# Altium footprint library PcbLib_ICs.PcbLib: 317 footprints (part 15 of 24)
Each footprint in its own frame and in the unit in brackets; x right, y up, seen from the top. Pads: shape width x height; smd on the part's side, far side on the other; paste and mask are expansions set on the pad; w line width, h text height; cw(c..) or ccw(c..) is an arc to the next point about the centre after c.
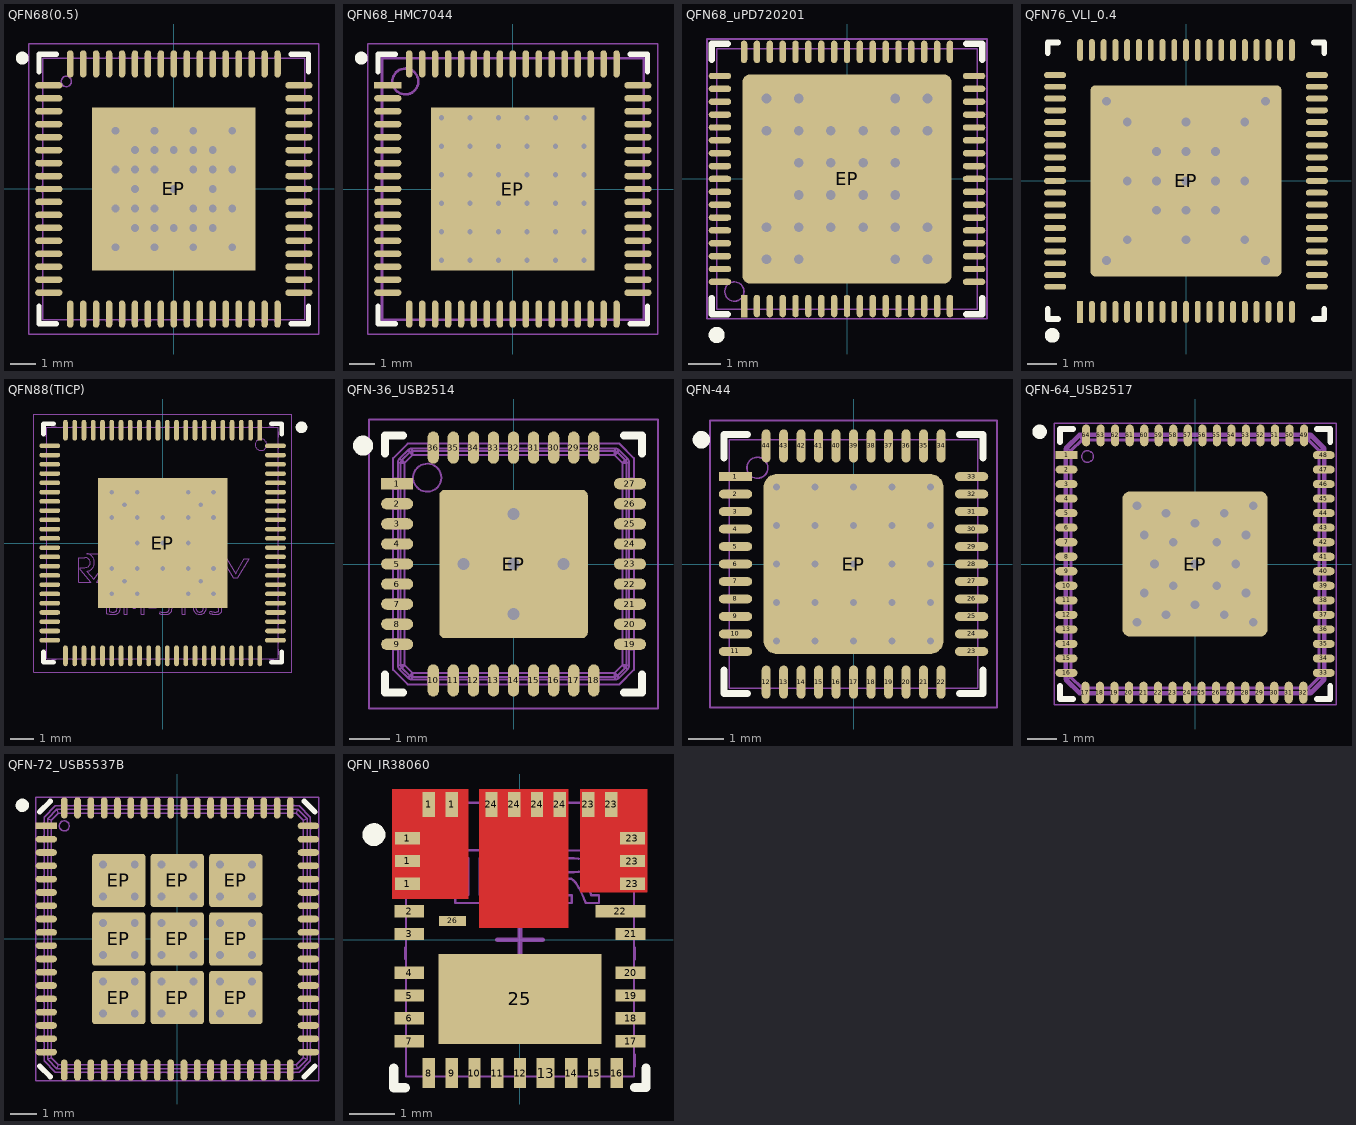
[diagram p14: the footprints below, top view; thin cyan lines are the x and y axes]

## QFN68(0.5) [mm] "QFN, 68-Leads, Body 10.00x10.00mm, Pitch 0.50mm, Thermal Pad 6.30x6.30mm, IPC Medium Density"
height 0.9
pads (69):
  oval 1.05x0.25 smd paste+0 mask+0.075: 1(-4.825,4) 2(-4.825,3.5) 3(-4.825,3) 4(-4.825,2.5) 5(-4.825,2) 6(-4.825,1.5) 7(-4.825,1) 8(-4.825,0.5) 9(-4.825,0) 10(-4.825,-0.5) 11(-4.825,-1) 12(-4.825,-1.5) 13(-4.825,-2) 14(-4.825,-2.5) 15(-4.825,-3) 16(-4.825,-3.5) 17(-4.825,-4) 35(4.825,-4) 36(4.825,-3.5) 37(4.825,-3) 38(4.825,-2.5) 39(4.825,-2) 40(4.825,-1.5) 41(4.825,-1) 42(4.825,-0.5) 43(4.825,0) 44(4.825,0.5) 45(4.825,1) 46(4.825,1.5) 47(4.825,2) 48(4.825,2.5) 49(4.825,3) 50(4.825,3.5) 51(4.825,4)
  oval 0.25x1.05 smd paste+0 mask+0.075: 18(-4,-4.825) 19(-3.5,-4.825) 20(-3,-4.825) 21(-2.5,-4.825) 22(-2,-4.825) 23(-1.5,-4.825) 24(-1,-4.825) 25(-0.5,-4.825) 26(0,-4.825) 27(0.5,-4.825) 28(1,-4.825) 29(1.5,-4.825) 30(2,-4.825) 31(2.5,-4.825) 32(3,-4.825) 33(3.5,-4.825) 34(4,-4.825) 52(4,4.825) 53(3.5,4.825) 54(3,4.825) 55(2.5,4.825) 56(2,4.825) 57(1.5,4.825) 58(1,4.825) 59(0.5,4.825) 60(0,4.825) 61(-0.5,4.825) 62(-1,4.825) 63(-1.5,4.825) 64(-2,4.825) 65(-2.5,4.825) 66(-3,4.825) 67(-3.5,4.825) 68(-4,4.825)
  rect 6.3x6.3 smd paste-50 mask+0.075: EP(0,0)
via -1.5,0.75 diameter 0.7 hole 0.3
via -1.5,-0.75 diameter 0.7 hole 0.3
via -2.25,0.75 diameter 0.7 hole 0.3
via -0.75,2.25 diameter 0.7 hole 0.3
via -2.25,2.25 diameter 0.7 hole 0.3
via -2.25,-0.75 diameter 0.7 hole 0.3
via -0.75,-2.25 diameter 0.7 hole 0.3
via -2.25,-2.25 diameter 0.7 hole 0.3
via -1.5,-1.5 diameter 0.7 hole 0.3
via -0.75,-0.75 diameter 0.7 hole 0.3
via 0.75,-2.25 diameter 0.7 hole 0.3
via 2.25,-0.75 diameter 0.7 hole 0.3
via 2.25,-2.25 diameter 0.7 hole 0.3
via 1.5,-1.5 diameter 0.7 hole 0.3
via 0.75,-0.75 diameter 0.7 hole 0.3
via 2.25,0.75 diameter 0.7 hole 0.3
via 0.75,2.25 diameter 0.7 hole 0.3
via 2.25,2.25 diameter 0.7 hole 0.3
via 1.5,1.5 diameter 0.7 hole 0.3
via 0.75,0.75 diameter 0.7 hole 0.3
via 0,0 diameter 0.7 hole 0.3
via -0.75,-1.5 diameter 0.7 hole 0.3
via 0.75,-1.5 diameter 0.7 hole 0.3
via 1.5,-0.75 diameter 0.7 hole 0.3
via 1.5,0.75 diameter 0.7 hole 0.3
via 0.75,1.5 diameter 0.7 hole 0.3
via -0.75,1.5 diameter 0.7 hole 0.3
via 0,1.5 diameter 0.7 hole 0.3
via -1.5,0 diameter 0.7 hole 0.3
via 0,-1.5 diameter 0.7 hole 0.3
via 1.5,0 diameter 0.7 hole 0.3
via -0.75,0.75 diameter 0.7 hole 0.3
via -1.5,1.5 diameter 0.7 hole 0.3
Top Overlay:
  circle w0.25: c-5.85,5.05 r0.125
  lines w0.2: -5.2,-4.525 -5.2,-5.2 -4.525,-5.2 ; -5.2,4.525 -5.2,5.2 -4.525,5.2 ; 4.525,-5.2 5.2,-5.2 5.2,-4.525 ; 4.525,5.2 5.2,5.2 5.2,4.525
Top Paste:
  region: 2.7,-2.7 2.7,-2.2 2.2,-2.2 2.2,-2.7
  region: -2.2,-2.7 -2.2,-2.2 -2.7,-2.2 -2.7,-2.7
  region: -1.5,-2.7 -1.5,-2.2 -2,-2.2 -2,-2.7
  region: -0.8,-2.7 -0.8,-2.2 -1.3,-2.2 -1.3,-2.7
  region: 1.3,-2.7 1.3,-2.2 0.8,-2.2 0.8,-2.7
  region: 2,-2.7 2,-2.2 1.5,-2.2 1.5,-2.7
  region: -0.1,-2.7 -0.1,-2.2 -0.6,-2.2 -0.6,-2.7
  region: 0.6,-2.7 0.6,-2.2 0.1,-2.2 0.1,-2.7
  region: -2.7,2.7 -2.7,2.2 -2.2,2.2 -2.2,2.7
  region: 2.2,2.7 2.2,2.2 2.7,2.2 2.7,2.7
  region: 1.5,2.7 1.5,2.2 2,2.2 2,2.7
  region: 0.8,2.7 0.8,2.2 1.3,2.2 1.3,2.7
  region: -1.3,2.7 -1.3,2.2 -0.8,2.2 -0.8,2.7
  region: -2,2.7 -2,2.2 -1.5,2.2 -1.5,2.7
  region: 0.1,2.7 0.1,2.2 0.6,2.2 0.6,2.7
  region: -0.6,2.7 -0.6,2.2 -0.1,2.2 -0.1,2.7
  region: -2.2,0.8 -2.2,1.3 -2.7,1.3 -2.7,0.8
  region: -2.7,2 -2.7,1.5 -2.2,1.5 -2.2,2
  region: -2.2,-2 -2.2,-1.5 -2.7,-1.5 -2.7,-2
  region: -2.7,-0.8 -2.7,-1.3 -2.2,-1.3 -2.2,-0.8
  region: -2.2,-0.6 -2.2,-0.1 -2.7,-0.1 -2.7,-0.6
  region: -2.7,0.6 -2.7,0.1 -2.2,0.1 -2.2,0.6
  region: 2.2,-0.8 2.2,-1.3 2.7,-1.3 2.7,-0.8
  region: 2.7,-2 2.7,-1.5 2.2,-1.5 2.2,-2
  region: 2.2,2 2.2,1.5 2.7,1.5 2.7,2
  region: 2.7,0.8 2.7,1.3 2.2,1.3 2.2,0.8
  region: 2.2,0.6 2.2,0.1 2.7,0.1 2.7,0.6
  region: 2.7,-0.6 2.7,-0.1 2.2,-0.1 2.2,-0.6
  region: 1.5,-0.8 1.5,-1.3 2,-1.3 2,-0.8
  region: 0.8,-0.8 0.8,-1.3 1.3,-1.3 1.3,-0.8
  region: 1.3,-2 1.3,-1.5 0.8,-1.5 0.8,-2
  region: 2,-2 2,-1.5 1.5,-1.5 1.5,-2
  region: -1.3,-0.8 -1.3,-1.3 -0.8,-1.3 -0.8,-0.8
  region: -2,-0.8 -2,-1.3 -1.5,-1.3 -1.5,-0.8
  region: -1.5,-2 -1.5,-1.5 -2,-1.5 -2,-2
  region: -0.8,-2 -0.8,-1.5 -1.3,-1.5 -1.3,-2
  region: 0.1,-0.8 0.1,-1.3 0.6,-1.3 0.6,-0.8
  region: -0.6,-0.8 -0.6,-1.3 -0.1,-1.3 -0.1,-0.8
  region: -0.1,-2 -0.1,-1.5 -0.6,-1.5 -0.6,-2
  region: 0.6,-2 0.6,-1.5 0.1,-1.5 0.1,-2
  region: 1.5,2 1.5,1.5 2,1.5 2,2
  region: 0.8,2 0.8,1.5 1.3,1.5 1.3,2
  region: 1.3,0.8 1.3,1.3 0.8,1.3 0.8,0.8
  region: 2,0.8 2,1.3 1.5,1.3 1.5,0.8
  region: -1.3,2 -1.3,1.5 -0.8,1.5 -0.8,2
  region: -2,2 -2,1.5 -1.5,1.5 -1.5,2
  region: -1.5,0.8 -1.5,1.3 -2,1.3 -2,0.8
  region: -0.8,0.8 -0.8,1.3 -1.3,1.3 -1.3,0.8
  region: 0.1,2 0.1,1.5 0.6,1.5 0.6,2
  region: -0.6,2 -0.6,1.5 -0.1,1.5 -0.1,2
  region: -0.1,0.8 -0.1,1.3 -0.6,1.3 -0.6,0.8
  region: 0.6,0.8 0.6,1.3 0.1,1.3 0.1,0.8
  region: 1.5,0.6 1.5,0.1 2,0.1 2,0.6
  region: 0.8,0.6 0.8,0.1 1.3,0.1 1.3,0.6
  region: 1.3,-0.6 1.3,-0.1 0.8,-0.1 0.8,-0.6
  region: 2,-0.6 2,-0.1 1.5,-0.1 1.5,-0.6
  region: -1.3,0.6 -1.3,0.1 -0.8,0.1 -0.8,0.6
  region: -2,0.6 -2,0.1 -1.5,0.1 -1.5,0.6
  region: -1.5,-0.6 -1.5,-0.1 -2,-0.1 -2,-0.6
  region: -0.8,-0.6 -0.8,-0.1 -1.3,-0.1 -1.3,-0.6
  region: 0.1,0.6 0.1,0.1 0.6,0.1 0.6,0.6
  region: -0.6,0.6 -0.6,0.1 -0.1,0.1 -0.1,0.6
  region: -0.1,-0.6 -0.1,-0.1 -0.6,-0.1 -0.6,-0.6
  region: 0.6,-0.6 0.6,-0.1 0.1,-0.1 0.1,-0.6
Bottom Solder:
  region: -3.25,3.25 -0.5,3.25 0,2.75 0.5,3.25 3.25,3.25 3.25,0.5 2.75,0 3.25,-0.5 3.25,-3.25 0.5,-3.25 0,-2.75 -0.5,-3.25 -3.25,-3.25 -3.25,-0.5 -2.75,0 -3.25,0.5
Top Assy:
  drawing of 209 lines, arcs and shapes, not listed
  text ".Designator" at -3.443,-0.467 h2
Top Text:
  lines w0.05: -5.6,-5.6 5.6,-5.6 5.6,5.6 -5.6,5.6 -5.6,-5.6
  lines w0.1: -0.5,0 0.5,0 ; 0,-0.5 0,0.5
3D body "QFN50P1000X1000X90_HS-69N.step": height 0.9, standoff 0, extent -5.07,-5.07 5.07,5.07

## QFN68_HMC7044 [mm] "HCP-68-1 case style"
height 0.9
pads (69):
  rect 1.05x0.25 smd mask+0.05: 1(-4.825,4)
  oval 1.05x0.25 smd mask+0.05: 2(-4.825,3.5) 3(-4.825,3) 4(-4.825,2.5) 5(-4.825,2) 6(-4.825,1.5) 7(-4.825,1) 8(-4.825,0.5) 9(-4.825,0) 10(-4.825,-0.5) 11(-4.825,-1) 12(-4.825,-1.5) 13(-4.825,-2) 14(-4.825,-2.5) 15(-4.825,-3) 16(-4.825,-3.5) 17(-4.825,-4) 35(4.825,-4) 36(4.825,-3.5) 37(4.825,-3) 38(4.825,-2.5) 39(4.825,-2) 40(4.825,-1.5) 41(4.825,-1) 42(4.825,-0.5) 43(4.825,0) 44(4.825,0.5) 45(4.825,1) 46(4.825,1.5) 47(4.825,2) 48(4.825,2.5) 49(4.825,3) 50(4.825,3.5) 51(4.825,4)
  oval 0.25x1.05 smd mask+0.05: 18(-4,-4.825) 19(-3.5,-4.825) 20(-3,-4.825) 21(-2.5,-4.825) 22(-2,-4.825) 23(-1.5,-4.825) 24(-1,-4.825) 25(-0.5,-4.825) 26(0,-4.825) 27(0.5,-4.825) 28(1,-4.825) 29(1.5,-4.825) 30(2,-4.825) 31(2.5,-4.825) 32(3,-4.825) 33(3.5,-4.825) 34(4,-4.825) 52(4,4.825) 53(3.5,4.825) 54(3,4.825) 55(2.5,4.825) 56(2,4.825) 57(1.5,4.825) 58(1,4.825) 59(0.5,4.825) 60(0,4.825) 61(-0.5,4.825) 62(-1,4.825) 63(-1.5,4.825) 64(-2,4.825) 65(-2.5,4.825) 66(-3,4.825) 67(-3.5,4.825) 68(-4,4.825)
  rect 6.3x6.3 smd mask+0.05: EP(0,0)
via 2.75,-2.75 diameter 0.4 hole 0.2
via 1.65,-2.75 diameter 0.4 hole 0.2
via 0.55,-2.75 diameter 0.4 hole 0.2
via -0.55,-2.75 diameter 0.4 hole 0.2
via -1.65,-2.75 diameter 0.4 hole 0.2
via -2.75,-2.75 diameter 0.4 hole 0.2
via 2.75,-1.65 diameter 0.4 hole 0.2
via 1.65,-1.65 diameter 0.4 hole 0.2
via 0.55,-1.65 diameter 0.4 hole 0.2
via -0.55,-1.65 diameter 0.4 hole 0.2
via -1.65,-1.65 diameter 0.4 hole 0.2
via -2.75,-1.65 diameter 0.4 hole 0.2
via 2.75,-0.55 diameter 0.4 hole 0.2
via 1.65,-0.55 diameter 0.4 hole 0.2
via 0.55,-0.55 diameter 0.4 hole 0.2
via -0.55,-0.55 diameter 0.4 hole 0.2
via -1.65,-0.55 diameter 0.4 hole 0.2
via -2.75,-0.55 diameter 0.4 hole 0.2
via 2.75,0.55 diameter 0.4 hole 0.2
via 1.65,0.55 diameter 0.4 hole 0.2
via 0.55,0.55 diameter 0.4 hole 0.2
via -0.55,0.55 diameter 0.4 hole 0.2
via -1.65,0.55 diameter 0.4 hole 0.2
via -2.75,0.55 diameter 0.4 hole 0.2
via 2.75,1.65 diameter 0.4 hole 0.2
via 1.65,1.65 diameter 0.4 hole 0.2
via 0.55,1.65 diameter 0.4 hole 0.2
via -0.55,1.65 diameter 0.4 hole 0.2
via -1.65,1.65 diameter 0.4 hole 0.2
via -2.75,1.65 diameter 0.4 hole 0.2
via 2.75,2.75 diameter 0.4 hole 0.2
via 1.65,2.75 diameter 0.4 hole 0.2
via 0.55,2.75 diameter 0.4 hole 0.2
via -0.55,2.75 diameter 0.4 hole 0.2
via -1.65,2.75 diameter 0.4 hole 0.2
via -2.75,2.75 diameter 0.4 hole 0.2
Top Overlay:
  circle w0.25: c-5.85,5.05 r0.125
  lines w0.2: -5.2,-4.525 -5.2,-5.2 -4.525,-5.2 ; -5.2,4.525 -5.2,5.2 -4.525,5.2 ; 4.525,-5.2 5.2,-5.2 5.2,-4.525 ; 4.525,5.2 5.2,5.2 5.2,4.525
Top Assy:
  circle w0.1: c-4.15,4.15 r0.5
  lines w0.1: -5.05,-5.05 5.05,-5.05 5.05,5.05 -5.05,5.05 -5.05,-5.05
Top Text:
  lines w0.05: -5.6,-5.6 5.6,-5.6 5.6,5.6 -5.6,5.6 -5.6,-5.6
  lines w0.1: -0.5,0 0.5,0 ; 0,-0.5 0,0.5
3D body "HCP-68-1.STEP": height 0.9, standoff -0.02, extent -5.02,-5.02 5.02,5.02

## QFN68_uPD720201 [mm] "QFN68, 8x8mm with 0.4mm pitch"
height 1
pads (69):
  rect 0.2x0.7 smd paste+0 mask+0.05: 1(-3.2,-3.95)
  oval 0.2x0.7 smd paste+0 mask+0.05: 2(-2.8,-3.95) 3(-2.4,-3.95) 4(-2,-3.95) 5(-1.6,-3.95) 6(-1.2,-3.95) 7(-0.8,-3.95) 8(-0.4,-3.95) 9(0,-3.95) 10(0.4,-3.95) 11(0.8,-3.95) 12(1.2,-3.95) 13(1.6,-3.95) 14(2,-3.95) 15(2.4,-3.95) 16(2.8,-3.95) 17(3.2,-3.95) 35(3.2,3.95) 36(2.8,3.95) 37(2.4,3.95) 38(2,3.95) 39(1.6,3.95) 40(1.2,3.95) 41(0.8,3.95) 42(0.4,3.95) 43(0,3.95) 44(-0.4,3.95) 45(-0.8,3.95) 46(-1.2,3.95) 47(-1.6,3.95) 48(-2,3.95) 49(-2.4,3.95) 50(-2.8,3.95) 51(-3.2,3.95)
  oval 0.7x0.2 smd paste+0 mask+0.05: 18(3.95,-3.2) 19(3.95,-2.8) 20(3.95,-2.4) 21(3.95,-2) 22(3.95,-1.6) 23(3.95,-1.2) 24(3.95,-0.8) 25(3.95,-0.4) 26(3.95,0) 27(3.95,0.4) 28(3.95,0.8) 29(3.95,1.2) 30(3.95,1.6) 31(3.95,2) 32(3.95,2.4) 33(3.95,2.8) 34(3.95,3.2) 52(-3.95,3.2) 53(-3.95,2.8) 54(-3.95,2.4) 55(-3.95,2) 56(-3.95,1.6) 57(-3.95,1.2) 58(-3.95,0.8) 59(-3.95,0.4) 60(-3.95,0) 61(-3.95,-0.4) 62(-3.95,-0.8) 63(-3.95,-1.2) 64(-3.95,-1.6) 65(-3.95,-2) 66(-3.95,-2.4) 67(-3.95,-2.8) 68(-3.95,-3.2)
  rrect7% 6.5x6.5 smd paste-50 mask+0.102: EP(0,0)
via 0.5,1.5 diameter 0.7 hole 0.3
via -0.5,1.5 diameter 0.7 hole 0.3
via -1.5,0.5 diameter 0.7 hole 0.3
via -1.5,-0.5 diameter 0.7 hole 0.3
via -0.5,-1.5 diameter 0.7 hole 0.3
via 0.5,-1.5 diameter 0.7 hole 0.3
via 1.5,0.5 diameter 0.7 hole 0.3
via 1.5,-0.5 diameter 0.7 hole 0.3
via 0.5,-0.5 diameter 0.7 hole 0.3
via 0.5,0.5 diameter 0.7 hole 0.3
via -0.5,0.5 diameter 0.7 hole 0.3
via -0.5,-0.5 diameter 0.7 hole 0.3
via 1.5,-1.5 diameter 0.7 hole 0.3
via 1.5,-2.5 diameter 0.7 hole 0.3
via 2.5,-1.5 diameter 0.7 hole 0.3
via 2.5,-2.5 diameter 0.7 hole 0.3
via 1.5,1.5 diameter 0.7 hole 0.3
via 1.5,2.5 diameter 0.7 hole 0.3
via 2.5,1.5 diameter 0.7 hole 0.3
via 2.5,2.5 diameter 0.7 hole 0.3
via -1.5,1.5 diameter 0.7 hole 0.3
via -1.5,2.5 diameter 0.7 hole 0.3
via -2.5,1.5 diameter 0.7 hole 0.3
via -2.5,2.5 diameter 0.7 hole 0.3
via -1.5,-1.5 diameter 0.7 hole 0.3
via -1.5,-2.5 diameter 0.7 hole 0.3
via -2.5,-1.5 diameter 0.7 hole 0.3
via -2.5,-2.5 diameter 0.7 hole 0.3
Top Overlay:
  circle w0.25: c-4.05,-4.85 r0.125
  lines w0.2: -4.2,-3.7 -4.2,-4.2 -3.7,-4.2 ; -4.2,3.7 -4.2,4.2 -3.7,4.2 ; 3.7,-4.2 4.2,-4.2 4.2,-3.7 ; 3.7,4.2 4.2,4.2 4.2,3.7
Top Paste:
  region: 2.7,2.7 2.2,2.7 2.2,2.2 2.7,2.2
  region: 2.7,-2.2 2.2,-2.2 2.2,-2.7 2.7,-2.7
  region: 2.7,-1.5 2.2,-1.5 2.2,-2 2.7,-2
  region: 2.7,-0.8 2.2,-0.8 2.2,-1.3 2.7,-1.3
  region: 2.7,1.3 2.2,1.3 2.2,0.8 2.7,0.8
  region: 2.7,2 2.2,2 2.2,1.5 2.7,1.5
  region: 2.7,-0.1 2.2,-0.1 2.2,-0.6 2.7,-0.6
  region: 2.7,0.6 2.2,0.6 2.2,0.1 2.7,0.1
  rectangle: -2.7,-2.7 -2.2,-2.2
  rectangle: -2.7,2.2 -2.2,2.7
  rectangle: -2.7,1.5 -2.2,2
  rectangle: -2.7,0.8 -2.2,1.3
  rectangle: -2.7,-1.3 -2.2,-0.8
  rectangle: -2.7,-2 -2.2,-1.5
  rectangle: -2.7,0.1 -2.2,0.6
  rectangle: -2.7,-0.6 -2.2,-0.1
  region: -0.8,-2.2 -1.3,-2.2 -1.3,-2.7 -0.8,-2.7
  rectangle: -2,-2.7 -1.5,-2.2
  region: 2,-2.2 1.5,-2.2 1.5,-2.7 2,-2.7
  rectangle: 0.8,-2.7 1.3,-2.2
  region: 0.6,-2.2 0.1,-2.2 0.1,-2.7 0.6,-2.7
  rectangle: -0.6,-2.7 -0.1,-2.2
  rectangle: 0.8,2.2 1.3,2.7
  region: 2,2.7 1.5,2.7 1.5,2.2 2,2.2
  rectangle: -2,2.2 -1.5,2.7
  region: -0.8,2.7 -1.3,2.7 -1.3,2.2 -0.8,2.2
  rectangle: -0.6,2.2 -0.1,2.7
  region: 0.6,2.7 0.1,2.7 0.1,2.2 0.6,2.2
  rectangle: 0.8,1.5 1.3,2
  rectangle: 0.8,0.8 1.3,1.3
  region: 2,1.3 1.5,1.3 1.5,0.8 2,0.8
  region: 2,2 1.5,2 1.5,1.5 2,1.5
  rectangle: 0.8,-1.3 1.3,-0.8
  rectangle: 0.8,-2 1.3,-1.5
  region: 2,-1.5 1.5,-1.5 1.5,-2 2,-2
  region: 2,-0.8 1.5,-0.8 1.5,-1.3 2,-1.3
  rectangle: 0.8,0.1 1.3,0.6
  rectangle: 0.8,-0.6 1.3,-0.1
  region: 2,-0.1 1.5,-0.1 1.5,-0.6 2,-0.6
  region: 2,0.6 1.5,0.6 1.5,0.1 2,0.1
  rectangle: -2,1.5 -1.5,2
  rectangle: -2,0.8 -1.5,1.3
  region: -0.8,1.3 -1.3,1.3 -1.3,0.8 -0.8,0.8
  region: -0.8,2 -1.3,2 -1.3,1.5 -0.8,1.5
  rectangle: -2,-1.3 -1.5,-0.8
  rectangle: -2,-2 -1.5,-1.5
  region: -0.8,-1.5 -1.3,-1.5 -1.3,-2 -0.8,-2
  region: -0.8,-0.8 -1.3,-0.8 -1.3,-1.3 -0.8,-1.3
  rectangle: -2,0.1 -1.5,0.6
  rectangle: -2,-0.6 -1.5,-0.1
  region: -0.8,-0.1 -1.3,-0.1 -1.3,-0.6 -0.8,-0.6
  region: -0.8,0.6 -1.3,0.6 -1.3,0.1 -0.8,0.1
  rectangle: -0.6,1.5 -0.1,2
  rectangle: -0.6,0.8 -0.1,1.3
  region: 0.6,1.3 0.1,1.3 0.1,0.8 0.6,0.8
  region: 0.6,2 0.1,2 0.1,1.5 0.6,1.5
  rectangle: -0.6,-1.3 -0.1,-0.8
  rectangle: -0.6,-2 -0.1,-1.5
  region: 0.6,-1.5 0.1,-1.5 0.1,-2 0.6,-2
  region: 0.6,-0.8 0.1,-0.8 0.1,-1.3 0.6,-1.3
  rectangle: -0.6,0.1 -0.1,0.6
  rectangle: -0.6,-0.6 -0.1,-0.1
  region: 0.6,-0.1 0.1,-0.1 0.1,-0.6 0.6,-0.6
  region: 0.6,0.6 0.1,0.6 0.1,0.1 0.6,0.1
Bottom Solder:
  region: -3.25,-3.25 -3.25,-0.5 -2.75,0 -3.25,0.5 -3.25,3.25 -0.5,3.25 0,2.75 0.5,3.25 3.25,3.25 3.25,0.5 2.75,0 3.25,-0.5 3.25,-3.25 0.5,-3.25 0,-2.75 -0.5,-3.25
Top Assy:
  drawing of 209 lines, arcs and shapes, not listed
  text ".Designator" at 0.467,-3.443 h2
Top Text:
  lines w0.05: -4.35,-4.35 4.35,-4.35 4.35,4.35 -4.35,4.35 -4.35,-4.35
  lines w0.1: -0.5,0 0.5,0 ; 0,-0.5 0,0.5
3D body "uPD720201.STEP": height 0.9, standoff 0, extent -4.025,-4.025 4.025,4.025

## QFN76_VLI_0.4 [mm] "QFN, 76-Leads, Body 9,00x9,00mm, Pitch 0,40mm"
height 0.9
pads (77):
  rect 0.2x0.75 smd mask+0.05: 1(-3.6,-4.45)
  oval 0.2x0.75 smd mask+0.05: 2(-3.2,-4.45) 3(-2.8,-4.45) 4(-2.4,-4.45) 5(-2,-4.45) 6(-1.6,-4.45) 7(-1.2,-4.45) 8(-0.8,-4.45) 9(-0.4,-4.45) 10(0,-4.45) 11(0.4,-4.45) 12(0.8,-4.45) 13(1.2,-4.45) 14(1.6,-4.45) 15(2,-4.45) 16(2.4,-4.45) 17(2.8,-4.45) 18(3.2,-4.45) 19(3.6,-4.45) 39(3.6,4.45) 40(3.2,4.45) 41(2.8,4.45) 42(2.4,4.45) 43(2,4.45) 44(1.6,4.45) 45(1.2,4.45) 46(0.8,4.45) 47(0.4,4.45) 48(0,4.45) 49(-0.4,4.45) 50(-0.8,4.45) 51(-1.2,4.45) 52(-1.6,4.45) 53(-2,4.45) 54(-2.4,4.45) 55(-2.8,4.45) 56(-3.2,4.45) 57(-3.6,4.45)
  oval 0.75x0.2 smd mask+0.05: 20(4.45,-3.6) 21(4.45,-3.2) 22(4.45,-2.8) 23(4.45,-2.4) 24(4.45,-2) 25(4.45,-1.6) 26(4.45,-1.2) 27(4.45,-0.8) 28(4.45,-0.4) 29(4.45,0) 30(4.45,0.4) 31(4.45,0.8) 32(4.45,1.2) 33(4.45,1.6) 34(4.45,2) 35(4.45,2.4) 36(4.45,2.8) 37(4.45,3.2) 38(4.45,3.6) 58(-4.45,3.6) 59(-4.45,3.2) 60(-4.45,2.8) 61(-4.45,2.4) 62(-4.45,2) 63(-4.45,1.6) 64(-4.45,1.2) 65(-4.45,0.8) 66(-4.45,0.4) 67(-4.45,0) 68(-4.45,-0.4) 69(-4.45,-0.8) 70(-4.45,-1.2) 71(-4.45,-1.6) 72(-4.45,-2) 73(-4.45,-2.4) 74(-4.45,-2.8) 75(-4.45,-3.2) 76(-4.45,-3.6)
  rrect5% 6.5x6.5 smd paste-3 mask+0.05: EP(0,0)
via 0,-2 diameter 0.7 hole 0.3
via -2,0 diameter 0.7 hole 0.3
via 0,2 diameter 0.7 hole 0.3
via 2,0 diameter 0.7 hole 0.3
via 2.707,-2.707 diameter 0.7 hole 0.3
via 2.707,2.707 diameter 0.7 hole 0.3
via -2.707,2.707 diameter 0.7 hole 0.3
via -2.707,-2.707 diameter 0.7 hole 0.3
via -2,-2 diameter 0.7 hole 0.3
via 2,-2 diameter 0.7 hole 0.3
via 2,2 diameter 0.7 hole 0.3
via -2,2 diameter 0.7 hole 0.3
via 1,-1 diameter 0.7 hole 0.3
via -1,0 diameter 0.7 hole 0.3
via -1,1 diameter 0.7 hole 0.3
via 0,-1 diameter 0.7 hole 0.3
via -1,-1 diameter 0.7 hole 0.3
via 0,1 diameter 0.7 hole 0.3
via 1,1 diameter 0.7 hole 0.3
via 0,0 diameter 0.7 hole 0.3
via 1,0 diameter 0.7 hole 0.3
Top Overlay:
  circle w0.25: c-4.55,-5.25 r0.125
  lines w0.2: -4.7,-4.35 -4.7,-4.7 -4.35,-4.7 ; -4.7,4.35 -4.7,4.7 -4.35,4.7 ; 4.35,-4.7 4.7,-4.7 4.7,-4.35 ; 4.35,4.7 4.7,4.7 4.7,4.35
Bottom Solder:
  region: -3.25,3.25 -0.75,3.25 0,2.5 0.75,3.25 3.25,3.25 3.25,0.75 2.5,0 3.25,-0.749 3.25,-3.25 0.75,-3.25 0,-2.5 -0.75,-3.25 -3.25,-3.25 -3.25,-0.75 -2.5,0 -3.25,0.75
Top Assy:
  text ".Designator" at -3.443,-0.467 h2
Top Text:
  lines w0.1: -0.5,0 0.5,0 ; 0,-0.5 0,0.5
3D body "QFN-76.STEP": height 0.9, standoff 0, extent -4.55,-4.55 4.55,4.55

## QFN88(TICP) [mm] "QFN, 88-Leads, Body 10.00x10.00mm, Pitch 0.40mm, Thermal Pad 5.60x5.60mm, IPC Medium Density"
height 0.75
pads (89):
  rect 0.2x0.9 smd mask+0.05: 1(4.2,4.875)
  oval 0.2x0.9 smd mask+0.05: 2(3.8,4.875) 3(3.4,4.875) 4(3,4.875) 5(2.6,4.875) 6(2.2,4.875) 7(1.8,4.875) 8(1.4,4.875) 9(1,4.875) 10(0.6,4.875) 11(0.2,4.875) 12(-0.2,4.875) 13(-0.6,4.875) 14(-1,4.875) 15(-1.4,4.875) 16(-1.8,4.875) 17(-2.2,4.875) 18(-2.6,4.875) 19(-3,4.875) 20(-3.4,4.875) 21(-3.8,4.875) 22(-4.2,4.875) 45(-4.2,-4.875) 46(-3.8,-4.875) 47(-3.4,-4.875) 48(-3,-4.875) 49(-2.6,-4.875) 50(-2.2,-4.875) 51(-1.8,-4.875) 52(-1.4,-4.875) 53(-1,-4.875) 54(-0.6,-4.875) 55(-0.2,-4.875) 56(0.2,-4.875) 57(0.6,-4.875) 58(1,-4.875) 59(1.4,-4.875) 60(1.8,-4.875) 61(2.2,-4.875) 62(2.6,-4.875) 63(3,-4.875) 64(3.4,-4.875) 65(3.8,-4.875) 66(4.2,-4.875)
  oval 0.9x0.2 smd mask+0.05: 23(-4.875,4.2) 24(-4.875,3.8) 25(-4.875,3.4) 26(-4.875,3) 27(-4.875,2.6) 28(-4.875,2.2) 29(-4.875,1.8) 30(-4.875,1.4) 31(-4.875,1) 32(-4.875,0.6) 33(-4.875,0.2) 34(-4.875,-0.2) 35(-4.875,-0.6) 36(-4.875,-1) 37(-4.875,-1.4) 38(-4.875,-1.8) 39(-4.875,-2.2) 40(-4.875,-2.6) 41(-4.875,-3) 42(-4.875,-3.4) 43(-4.875,-3.8) 44(-4.875,-4.2) 67(4.875,-4.2) 68(4.875,-3.8) 69(4.875,-3.4) 70(4.875,-3) 71(4.875,-2.6) 72(4.875,-2.2) 73(4.875,-1.8) 74(4.875,-1.4) 75(4.875,-1) 76(4.875,-0.6) 77(4.875,-0.2) 78(4.875,0.2) 79(4.875,0.6) 80(4.875,1) 81(4.875,1.4) 82(4.875,1.8) 83(4.875,2.2) 84(4.875,2.6) 85(4.875,3) 86(4.875,3.4) 87(4.875,3.8) 88(4.875,4.2)
  rect 5.6x5.6 smd paste-3 mask+0.05: EP(0,0)
via -2.2,2.2 diameter 0.5 hole 0.2
via -1.1,2.2 diameter 0.5 hole 0.2
via 1.1,2.2 diameter 0.5 hole 0.2
via 2.2,2.2 diameter 0.5 hole 0.2
via -2.2,1.1 diameter 0.5 hole 0.2
via -1.1,1.1 diameter 0.5 hole 0.2
via 0,1.1 diameter 0.5 hole 0.2
via 1.1,1.1 diameter 0.5 hole 0.2
via 2.2,1.1 diameter 0.5 hole 0.2
via -1.1,0 diameter 0.5 hole 0.2
via 0,0 diameter 0.5 hole 0.2
via 1.1,0 diameter 0.5 hole 0.2
via -2.2,-1.1 diameter 0.5 hole 0.2
via -1.1,-1.1 diameter 0.5 hole 0.2
via 0,-1.1 diameter 0.5 hole 0.2
via 1.1,-1.1 diameter 0.5 hole 0.2
via 2.2,-1.1 diameter 0.5 hole 0.2
via -2.2,-2.2 diameter 0.5 hole 0.2
via -1.1,-2.2 diameter 0.5 hole 0.2
via 1.1,-2.2 diameter 0.5 hole 0.2
via 2.2,-2.2 diameter 0.5 hole 0.2
via 1.65,-1.65 diameter 0.5 hole 0.2
via -1.65,-1.65 diameter 0.5 hole 0.2
via 1.65,1.65 diameter 0.5 hole 0.2
via -1.65,1.65 diameter 0.5 hole 0.2
Top Overlay:
  circle w0.25: c6,5 r0.125
  lines w0.2: -5.15,-4.7 -5.15,-5.15 -4.7,-5.15 ; -5.15,4.7 -5.15,5.15 -4.7,5.15 ; 4.7,-5.15 5.15,-5.15 5.15,-4.7 ; 4.7,5.15 5.15,5.15 5.15,4.7
Top Paste:
  region: 0.6,-0.6 0.6,-0.1 0.1,-0.1 0.1,-0.6
  region: -0.1,-0.6 -0.1,-0.1 -0.6,-0.1 -0.6,-0.6
  region: -0.6,0.6 -0.6,0.1 -0.1,0.1 -0.1,0.6
  region: 0.1,0.6 0.1,0.1 0.6,0.1 0.6,0.6
  region: -0.8,-0.6 -0.8,-0.1 -1.3,-0.1 -1.3,-0.6
  region: -1.5,-0.6 -1.5,-0.1 -2,-0.1 -2,-0.6
  region: -2,0.6 -2,0.1 -1.5,0.1 -1.5,0.6
  region: -1.3,0.6 -1.3,0.1 -0.8,0.1 -0.8,0.6
  region: 2,-0.6 2,-0.1 1.5,-0.1 1.5,-0.6
  region: 1.3,-0.6 1.3,-0.1 0.8,-0.1 0.8,-0.6
  region: 0.8,0.6 0.8,0.1 1.3,0.1 1.3,0.6
  region: 1.5,0.6 1.5,0.1 2,0.1 2,0.6
  region: 0.6,0.8 0.6,1.3 0.1,1.3 0.1,0.8
  region: -0.1,0.8 -0.1,1.3 -0.6,1.3 -0.6,0.8
  region: -0.6,2 -0.6,1.5 -0.1,1.5 -0.1,2
  region: 0.1,2 0.1,1.5 0.6,1.5 0.6,2
  region: -0.8,0.8 -0.8,1.3 -1.3,1.3 -1.3,0.8
  region: -1.5,0.8 -1.5,1.3 -2,1.3 -2,0.8
  region: -2,2 -2,1.5 -1.5,1.5 -1.5,2